# Altium footprint library cool_library.PcbLib: 1182 footprints (part 8 of 75)
Each footprint in its own frame and in the unit in brackets; x right, y up, seen from the top. Pads: shape width x height; smd on the part's side, far side on the other; paste and mask are expansions set on the pad; w line width, h text height; cw(c..) or ccw(c..) is an arc to the next point about the centre after c.
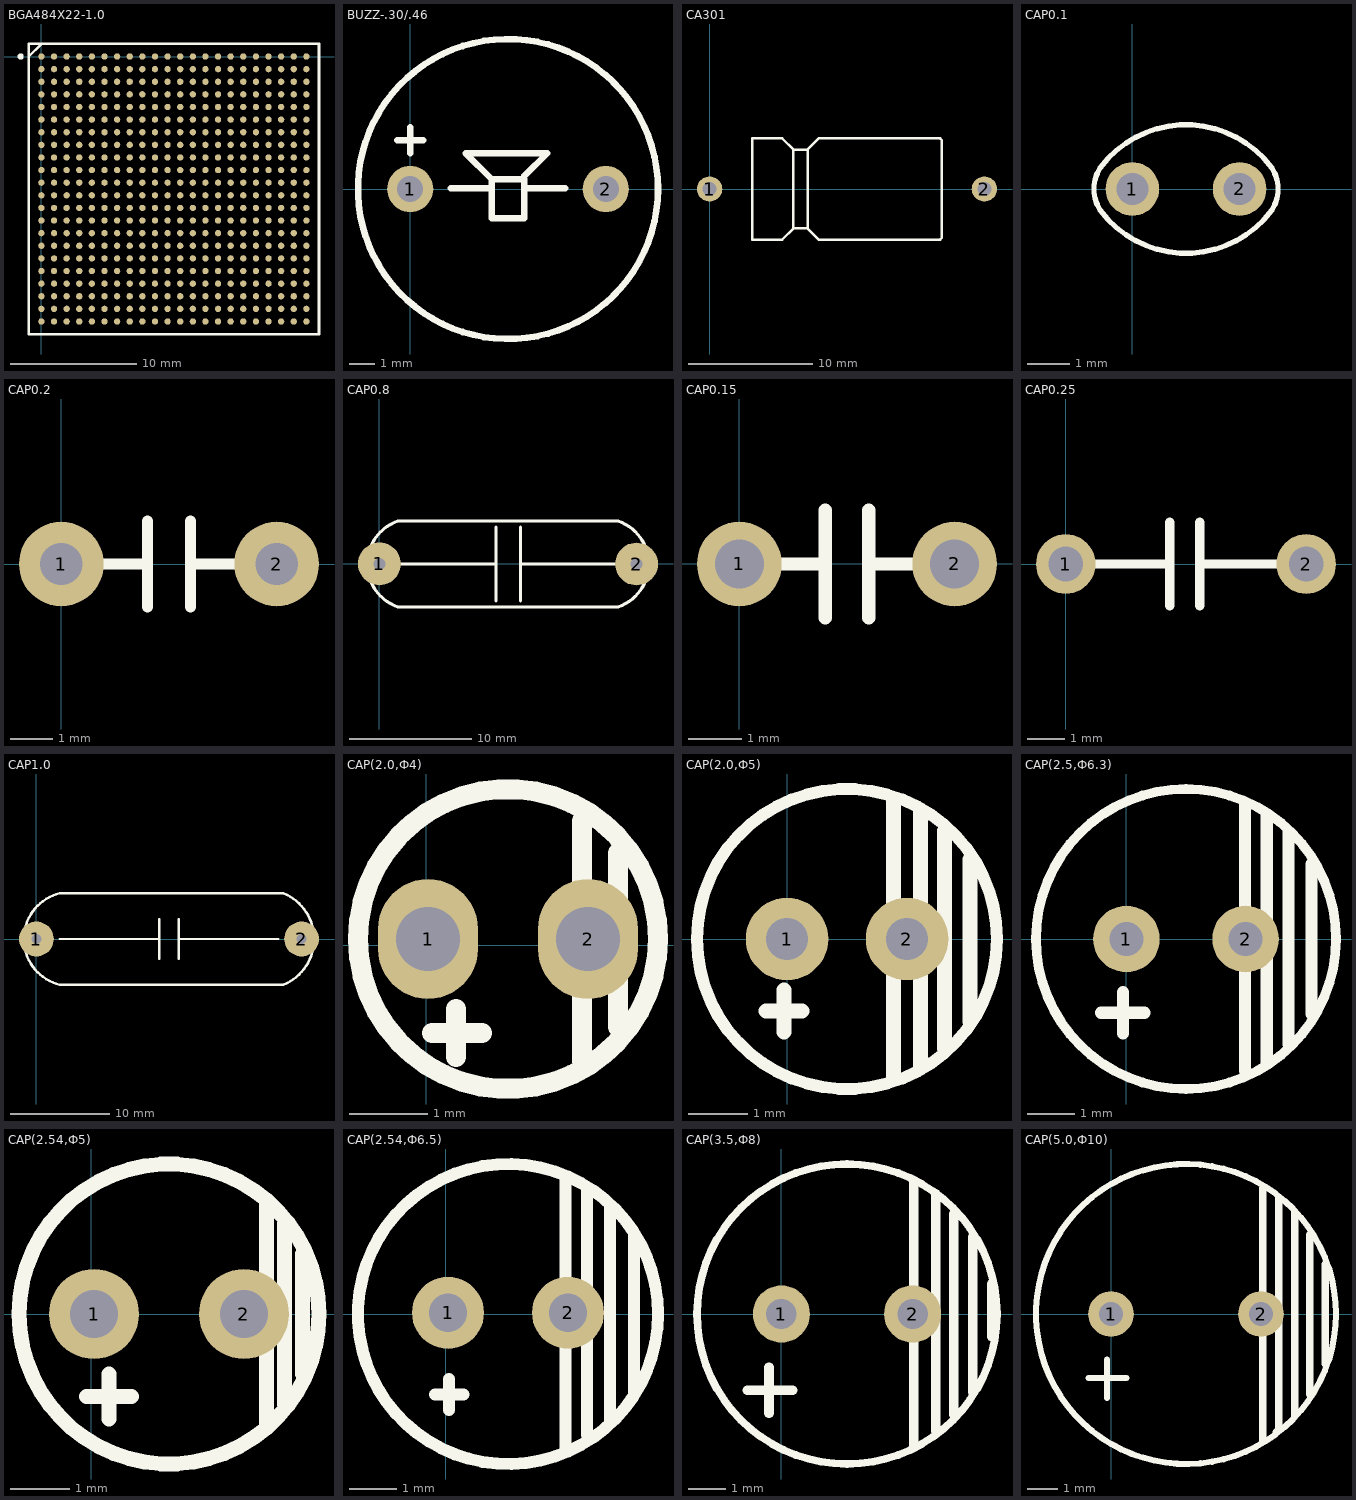
[diagram p7: the footprints below, top view; thin cyan lines are the x and y axes]

## BGA484X22-1.0 [mm]
height 2.032
pads (484):
  round 0.5 smd: A1(0,0) A2(1,0) A3(2,0) A4(3,0) A5(4,0) A6(5,0) A7(6,0) A8(7,0) A9(8,0) A10(9,0) A11(10,0) A12(11,0) A13(12,0) A14(13,0) A15(14,0) A16(15,0) A17(16,0) A18(17,0) A19(18,0) A20(19,0) A21(20,0) A22(21,0) AA1(0,-20) AA2(1,-20) AA3(2,-20) AA4(3,-20) AA5(4,-20) AA6(5,-20) AA7(6,-20) AA8(7,-20) AA9(8,-20) AA10(9,-20) AA11(10,-20) AA12(11,-20) AA13(12,-20) AA14(13,-20) AA15(14,-20) AA16(15,-20) AA17(16,-20) AA18(17,-20) AA19(18,-20) AA20(19,-20) AA21(20,-20) AA22(21,-20) AB1(0,-21) AB2(1,-21) AB3(2,-21) AB4(3,-21) AB5(4,-21) AB6(5,-21) AB7(6,-21) AB8(7,-21) AB9(8,-21) AB10(9,-21) AB11(10,-21) AB12(11,-21) AB13(12,-21) AB14(13,-21) AB15(14,-21) AB16(15,-21) AB17(16,-21) AB18(17,-21) AB19(18,-21) AB20(19,-21) AB21(20,-21) AB22(21,-21) B1(0,-1) B2(1,-1) B3(2,-1) B4(3,-1) B5(4,-1) B6(5,-1) B7(6,-1) B8(7,-1) B9(8,-1) B10(9,-1) B11(10,-1) B12(11,-1) B13(12,-1) B14(13,-1) B15(14,-1) B16(15,-1) B17(16,-1) B18(17,-1) B19(18,-1) B20(19,-1) B21(20,-1) B22(21,-1) C1(0,-2) C2(1,-2) C3(2,-2) C4(3,-2) C5(4,-2) C6(5,-2) C7(6,-2) C8(7,-2) C9(8,-2) C10(9,-2) C11(10,-2) C12(11,-2) C13(12,-2) C14(13,-2) C15(14,-2) C16(15,-2) C17(16,-2) C18(17,-2) C19(18,-2) C20(19,-2) C21(20,-2) C22(21,-2) D1(0,-3) D2(1,-3) D3(2,-3) D4(3,-3) D5(4,-3) D6(5,-3) D7(6,-3) D8(7,-3) D9(8,-3) D10(9,-3) D11(10,-3) D12(11,-3) D13(12,-3) D14(13,-3) D15(14,-3) D16(15,-3) D17(16,-3) D18(17,-3) D19(18,-3) D20(19,-3) D21(20,-3) D22(21,-3) E1(0,-4) E2(1,-4) E3(2,-4) E4(3,-4) E5(4,-4) E6(5,-4) E7(6,-4) E8(7,-4) E9(8,-4) E10(9,-4) E11(10,-4) E12(11,-4) E13(12,-4) E14(13,-4) E15(14,-4) E16(15,-4) E17(16,-4) E18(17,-4) E19(18,-4) E20(19,-4) E21(20,-4) E22(21,-4) F1(0,-5) F2(1,-5) F3(2,-5) F4(3,-5) F5(4,-5) F6(5,-5) F7(6,-5) F8(7,-5) F9(8,-5) F10(9,-5) F11(10,-5) F12(11,-5) F13(12,-5) F14(13,-5) F15(14,-5) F16(15,-5) F17(16,-5) F18(17,-5) F19(18,-5) F20(19,-5) F21(20,-5) F22(21,-5) G1(0,-6) G2(1,-6) G3(2,-6) G4(3,-6) G5(4,-6) G6(5,-6) G7(6,-6) G8(7,-6) G9(8,-6) G10(9,-6) G11(10,-6) G12(11,-6) G13(12,-6) G14(13,-6) G15(14,-6) G16(15,-6) G17(16,-6) G18(17,-6) G19(18,-6) G20(19,-6) G21(20,-6) G22(21,-6) H1(0,-7) H2(1,-7) H3(2,-7) H4(3,-7) H5(4,-7) H6(5,-7) H7(6,-7) H8(7,-7) H9(8,-7) H10(9,-7) H11(10,-7) H12(11,-7) H13(12,-7) H14(13,-7) H15(14,-7) H16(15,-7) H17(16,-7) H18(17,-7) H19(18,-7) H20(19,-7) H21(20,-7) H22(21,-7) J1(0,-8) J2(1,-8) J3(2,-8) J4(3,-8) J5(4,-8) J6(5,-8) J7(6,-8) J8(7,-8) J9(8,-8) J10(9,-8) J11(10,-8) J12(11,-8) J13(12,-8) J14(13,-8) J15(14,-8) J16(15,-8) J17(16,-8) J18(17,-8) J19(18,-8) J20(19,-8) J21(20,-8) J22(21,-8) K1(0,-9) K2(1,-9) K3(2,-9) K4(3,-9) K5(4,-9) K6(5,-9) K7(6,-9) K8(7,-9) K9(8,-9) K10(9,-9) K11(10,-9) K12(11,-9) K13(12,-9) K14(13,-9) K15(14,-9) K16(15,-9) K17(16,-9) K18(17,-9) K19(18,-9) K20(19,-9) K21(20,-9) K22(21,-9) L1(0,-10) L2(1,-10) L3(2,-10) L4(3,-10) L5(4,-10) L6(5,-10) L7(6,-10) L8(7,-10) L9(8,-10) L10(9,-10) L11(10,-10) L12(11,-10) L13(12,-10) L14(13,-10) L15(14,-10) L16(15,-10) L17(16,-10) L18(17,-10) L19(18,-10) L20(19,-10) L21(20,-10) L22(21,-10) M1(0,-11) M2(1,-11) M3(2,-11) M4(3,-11) M5(4,-11) M6(5,-11) M7(6,-11) M8(7,-11) M9(8,-11) M10(9,-11) M11(10,-11) M12(11,-11) M13(12,-11) M14(13,-11) M15(14,-11) M16(15,-11) M17(16,-11) M18(17,-11) M19(18,-11) M20(19,-11) M21(20,-11) M22(21,-11) N1(0,-12) N2(1,-12) N3(2,-12) N4(3,-12) N5(4,-12) N6(5,-12) N7(6,-12) N8(7,-12) N9(8,-12) N10(9,-12) N11(10,-12) N12(11,-12) N13(12,-12) N14(13,-12) N15(14,-12) N16(15,-12) N17(16,-12) N18(17,-12) N19(18,-12) N20(19,-12) N21(20,-12) N22(21,-12) P1(0,-13) P2(1,-13) P3(2,-13) P4(3,-13) P5(4,-13) P6(5,-13) P7(6,-13) P8(7,-13) P9(8,-13) P10(9,-13) P11(10,-13) P12(11,-13) P13(12,-13) P14(13,-13) P15(14,-13) P16(15,-13) P17(16,-13) P18(17,-13) P19(18,-13) P20(19,-13) P21(20,-13) P22(21,-13) R1(0,-14) R2(1,-14) R3(2,-14) R4(3,-14) R5(4,-14) R6(5,-14) R7(6,-14) R8(7,-14) R9(8,-14) R10(9,-14) R11(10,-14) R12(11,-14) R13(12,-14) R14(13,-14) R15(14,-14) R16(15,-14) R17(16,-14) R18(17,-14) R19(18,-14) R20(19,-14) R21(20,-14) R22(21,-14) T1(0,-15) T2(1,-15) T3(2,-15) T4(3,-15) T5(4,-15) T6(5,-15) T7(6,-15) T8(7,-15) T9(8,-15) T10(9,-15) T11(10,-15) T12(11,-15) T13(12,-15) T14(13,-15) T15(14,-15) T16(15,-15) T17(16,-15) T18(17,-15) T19(18,-15) T20(19,-15) T21(20,-15) T22(21,-15) U1(0,-16) U2(1,-16) U3(2,-16) U4(3,-16) U5(4,-16) U6(5,-16) U7(6,-16) U8(7,-16) U9(8,-16) U10(9,-16) U11(10,-16) U12(11,-16) U13(12,-16) U14(13,-16) U15(14,-16) U16(15,-16) U17(16,-16) U18(17,-16) U19(18,-16) U20(19,-16) U21(20,-16) U22(21,-16) V1(0,-17) V2(1,-17) V3(2,-17) V4(3,-17) V5(4,-17) V6(5,-17) V7(6,-17) V8(7,-17) V9(8,-17) V10(9,-17) V11(10,-17) V12(11,-17) V13(12,-17) V14(13,-17) V15(14,-17) V16(15,-17) V17(16,-17) V18(17,-17) V19(18,-17) V20(19,-17) V21(20,-17) V22(21,-17) W1(0,-18) W2(1,-18) W3(2,-18) W4(3,-18) W5(4,-18) W6(5,-18) W7(6,-18) W8(7,-18) W9(8,-18) W10(9,-18) W11(10,-18) W12(11,-18) W13(12,-18) W14(13,-18) W15(14,-18) W16(15,-18) W17(16,-18) W18(17,-18) W19(18,-18) W20(19,-18) W21(20,-18) W22(21,-18) Y1(0,-19) Y2(1,-19) Y3(2,-19) Y4(3,-19) Y5(4,-19) Y6(5,-19) Y7(6,-19) Y8(7,-19) Y9(8,-19) Y10(9,-19) Y11(10,-19) Y12(11,-19) Y13(12,-19) Y14(13,-19) Y15(14,-19) Y16(15,-19) Y17(16,-19) Y18(17,-19) Y19(18,-19) Y20(19,-19) Y21(20,-19) Y22(21,-19)
Top Overlay:
  circle w0.25: c-1.65,0 r0.125
  lines w0.2: -1,0 0,1 ; -1,-22 -1,1 22,1 22,-22 -1,-22

## BUZZ-.30/.46 [mm]
pads (2):
  round 1.8 hole 1.016: 1(0,0) 2(7.62,0)
Top Overlay:
  circle w0.254: c3.81,0 r5.842
  lines w0.254: -0.508,1.905 0.508,1.905 ; 0,1.397 0,2.413 ; 1.575,0.025 3.175,0.025 ; 4.445,0.025 6.045,0.025 ; 4.445,0.506 5.334,1.395 2.159,1.395 3.175,0.379 ; 3.175,0.379 3.175,-1.145 4.445,-1.145 4.445,0.379 3.175,0.379

## CA301 [mil]
pads (2):
  round 80 hole 45: 1(0,0) 2(870,0)
Top Overlay:
  lines w8: 265,-115 265,-125 ; 265,-125 230,-160 135,-160 135,160 230,160 265,125 ; 265,-125 265,125 ; 265,-125 310,-125 ; 265,125 305,125 310,125 ; 310,-125 310,125 ; 310,-125 345,-160 730,-160 735,-155 735,155 730,160 345,160 310,125

## CAP0.1 [mil]
pads (2):
  round 50 hole 30: 1(0,0) 2(100,0)
Top Overlay:
  lines w5: -30,-20 ccw(c50,40) 130,-20 ; -30,20 cw(c50,-40) 130,20 ; -29.95,-19.97 cw(c0,0) -29.95,19.97 ; 129.95,-19.97 ccw(c100,0) 129.95,19.97

## CAP0.2 [mm]
pads (2):
  round 2 hole 1: 1(0,0) 2(5.08,0)
Top Overlay:
  lines w0.254: 1.016,0 1.524,0 2.032,0 2.032,-1.016 2.032,1.016 ; 3.048,-1.016 3.048,1.016 ; 3.048,0 4.064,0

## CAP0.8 [mm]
pads (2):
  round 3.5 hole 1: 1(0,0) 2(21.007,-0.01)
Top Overlay:
  lines w0.25: 0.007,-0.01 9.507,-0.01 ; 9.507,-3.01 9.507,2.99 ; 11.507,-3.01 11.507,2.99 ; 11.507,-0.01 21.007,-0.01 ; 1.507,-3.51 cw(c2.707,-0.01) 1.507,3.49 19.507,3.49 cw(c18.307,-0.01) 19.507,-3.51 1.507,-3.51

## CAP0.15 [mil]
pads (2):
  round 62 hole 36: 1(0,0) 2(157.48,0)
Top Overlay:
  lines w9.84: 19.68,0 62.99,0 ; 62.99,-39.37 62.99,39.37 ; 94.49,-39.37 94.49,39.37 ; 94.49,0 137.79,0

## CAP0.25 [mil]
pads (2):
  round 62 hole 36: 1(0,0) 2(250,0)
Top Overlay:
  lines w9.84: 25,0 107.99,0 ; 107.99,-43.31 107.99,43.31 ; 139.49,-43.31 139.49,43.31 ; 139.49,0 225,0

## CAP1.0 [mm]
pads (2):
  round 3.5 hole 1: 1(0,0) 2(26.67,0)
Top Overlay:
  lines w0.25: 2.335,0 12.335,0 ; 12.335,-2 12.335,2 ; 14.335,-2 14.335,2 ; 14.335,0 24.335,0 ; 2.335,-4.6 cw(c3.474,0) 2.335,4.6 24.835,4.6 cw(c22.974,0) 24.835,-4.6 2.335,-4.6

## CAP(2.0,Ф4) [mil]
pads (2):
  oval 50x60 hole 32: 1(1,3) 2(81,3)
Top Overlay:
  circle w10: c41,3 r75
  lines w10: 3,-44 28,-44 ; 15,-56 15,-32 ; 78,-58 78,62 ; 96,-41 96,46

## CAP(2.0,Ф5) [mil]
pads (2):
  round 55 hole 28: 1(0,0) 2(80,0)
Top Overlay:
  circle w8: c40,0 r100
  lines w10: -14,-48 10,-48 ; -2,-62 -2,-34 ; 71,-93 71,92 ; 89,-86 89,86 ; 105,-73 105,72 ; 122,-55 122,53

## CAP(2.5,Ф6.3) [mil]
pads (2):
  round 55 hole 28: 1(0,0) 2(98.43,0)
Top Overlay:
  circle w8: c49.21,0 r124.02
  lines w10: -21,-61 15,-61 ; -3,-78 -3,-44 ; 98,-109 98,112 ; 116,-102 116,103 ; 134,-87 134,89 ; 153,-62 153,62

## CAP(2.54,Ф5) [mil]
pads (2):
  round 60 hole 32: 1(2,0) 2(102,0)
Top Overlay:
  circle w10: c52,0 r100
  lines w10: -3,-55 27,-55 ; 12,-70 12,-40 ; 117,-75 117,75 ; 129,-60 129,60 ; 141,-40 141,40

## CAP(2.54,Ф6.5) [mil]
pads (2):
  round 60 hole 32: 1(2,1) 2(102,1)
Top Overlay:
  circle w10: c52,0 r125
  lines w10: -9,-67 15,-67 ; 3,-80 3,-54 ; 100,-112 100,115 ; 118,-101 118,102 ; 137,-90 137,90 ; 157,-65 157,65

## CAP(3.5,Ф8) [mil]
pads (2):
  round 60 hole 32: 1(0,0) 2(137.79,0)
Top Overlay:
  circle w8: c68.9,0 r157.48
  lines w10: -36,-80 12,-80 ; -13,-104 -13,-56 ; 139,-137 139,140 ; 162,-123 162,126 ; 181,-106 181,105 ; 201,-82 201,81 ; 221,-24 221,32

## CAP(5.0,Ф10) [mil]
pads (2):
  round 60 hole 32: 1(0,0) 2(196.85,0)
Top Overlay:
  circle w8: c98.43,0 r196.85
  lines w8: -29.43,-84 20.57,-84 ; -5,-110 -5,-60
  lines w10: 199,-167 199,165 ; 217,-155 220,-152 220,153 ; 241,-133 241,134 ; 261,-105 261,104 ; 281,-65 281,65